# Altium footprint library Nanjar's Library.PcbLib: 153 footprints (part 6 of 10)
Each footprint in its own frame and in the unit in brackets; x right, y up, seen from the top. Pads: shape width x height; smd on the part's side, far side on the other; paste and mask are expansions set on the pad; w line width, h text height; cw(c..) or ccw(c..) is an arc to the next point about the centre after c.
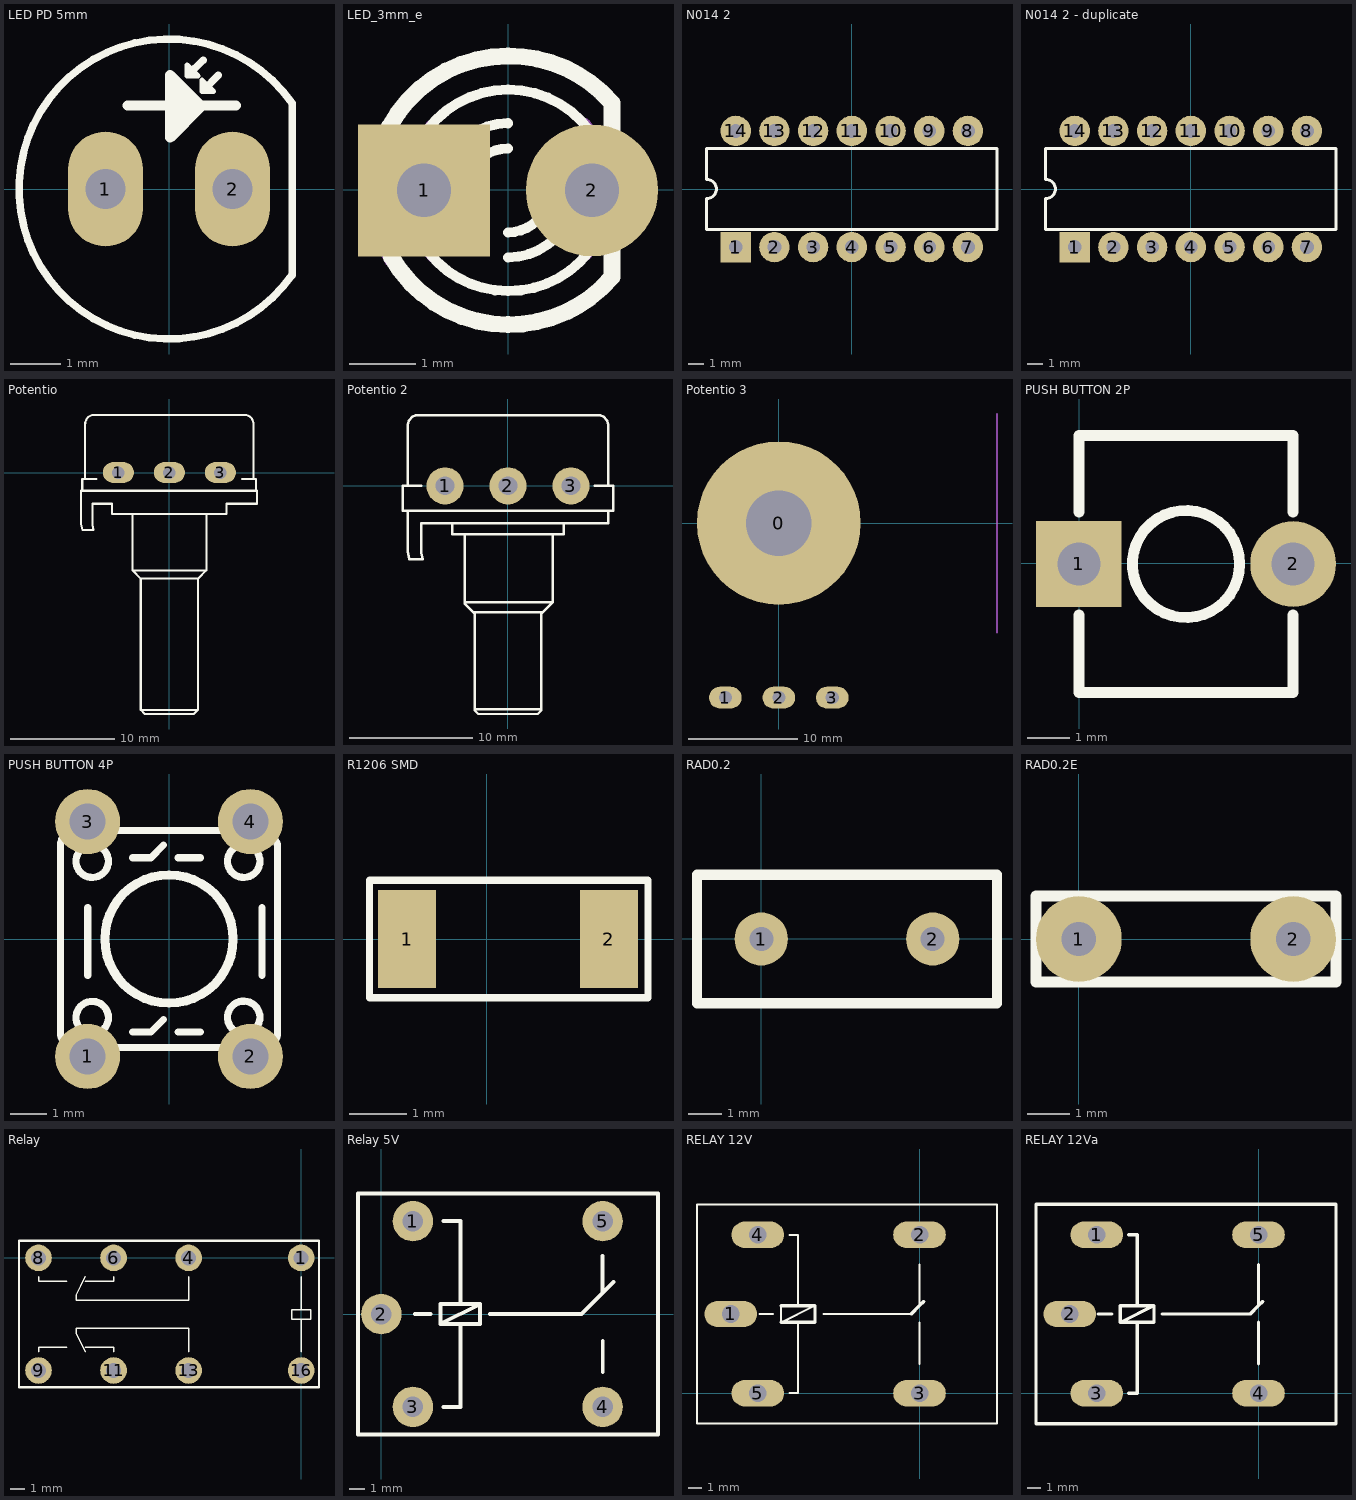
[diagram p5: the footprints below, top view; thin cyan lines are the x and y axes]

## LED PD 5mm [mm]
pads (2):
  oval 1.5x2.3 hole 0.8: 1(-1.27,0) 2(1.27,0)
Top Overlay:
  lines w0.1: 0.128,1.765 0.128,1.986 0.352,1.762 ; 0.155,1.316 0.379,1.54 0.158,1.54 ; 0.36,2.261 0.584,2.261 0.36,2.485 0.36,2.264 ; 0.664,1.954 0.888,1.954 0.664,2.178 0.664,1.957
  lines w0.15: 0.386,2.285 0.68,2.579 ; 0.69,1.978 0.984,2.272 ; 2.458,-1.72 cw(c0,0) 2.458,1.72 ; 2.46,-1.72 2.46,0.45 ; 2.46,0.453 2.46,1.715
  lines w0.2: -0.825,1.666 1.34,1.666 ; 0.024,1.025 0.637,1.638 ; 0.024,1.026 0.024,2.279 0.637,1.666
  lines w0.3: 0.128,1.762 0.352,1.762 ; 0.155,1.316 0.155,1.54
3D body "User Library-Photo Diode.step": height 8.5, standoff -2, extent -3,-3 2.5,3

## LED_3mm_e [mm]
pads (2):
  rect 2x2 hole 0.813: 1(-1.27,-0.009)
  round 2 hole 0.813: 2(1.27,-0.009)
Top Overlay:
  lines w0.152: -1.22,0.905 cw(c0,-0.009) 0,1.515 cw(c0.005,-0.012) 1.244,0.88 ; -1.203,-0.945 ccw(c0,-0.009) 0,-1.533 ccw(c0.008,0.007) 1.219,-0.945 ; -1.016,-0.009 cw(c0,-0.009) 0,1.007 ; -0.635,-0.009 cw(c0,-0.009) 0,0.626 ; 0,-1.025 ccw(c0,-0.009) 1.016,-0.009 ; 0,-0.644 ccw(c0,-0.009) 0.635,-0.009
  lines w0.254: -1.793,0.956 cw(c-0.008,-0.005) 0,2.023 cw(c0.028,-0.014) 1.574,1.312 ; -1.765,-1.017 ccw(c0,-0.009) 0,-2.041 ccw(c0.011,0.016) 1.574,-1.322 ; 1.574,-1.279 1.574,1.261
Mechanical 16:
  lines w0.152: -1.171,0.981 ccw(c0.02,-0.002) -1.524,-0.009 ccw(c0,-0.009) -1.139,-1.022 ; 1.168,1.007 cw(c-0.027,0.018) 1.524,-0.009 cw(c0.011,-0.041) 1.193,-0.985
  lines w0.254: -1.789,0.956 ccw(c0.003,-0.008) -2.032,-0.009 ccw(c0,-0.009) -1.731,-1.074

## N014 2 [mm] "DIP; 14 Leads; Row Spacing 7.62 mm; Pitch 2.54 mm"
height 5.08
pads (14):
  rect 2x2 hole 0.9: 1(-7.62,-3.81)
  round 2 hole 0.9: 2(-5.08,-3.81) 3(-2.54,-3.81) 4(0,-3.81) 5(2.54,-3.81) 6(5.08,-3.81) 7(7.62,-3.81) 8(7.62,3.81) 9(5.08,3.81) 10(2.54,3.81) 11(0,3.81) 12(-2.54,3.81) 13(-5.08,3.81) 14(-7.62,3.81)
Top Overlay:
  lines w0.2: -9.525,-2.65 9.525,-2.65 9.525,2.65 -9.525,2.65 -9.525,0.635 cw(c-9.525,0) -9.525,-0.635 -9.525,-2.65
3D body "SW3DPS-DIP-14-DEFAULT.STEP": height 3.51, standoff -3.47, extent -9.525,-3.95 9.525,4.05

## N014 2 - duplicate [mm] "DIP; 14 Leads; Row Spacing 7.62 mm; Pitch 2.54 mm"
height 5.08
pads (14):
  rect 2x2 hole 0.9: 1(-7.62,-3.81)
  round 2 hole 0.9: 2(-5.08,-3.81) 3(-2.54,-3.81) 4(0,-3.81) 5(2.54,-3.81) 6(5.08,-3.81) 7(7.62,-3.81) 8(7.62,3.81) 9(5.08,3.81) 10(2.54,3.81) 11(0,3.81) 12(-2.54,3.81) 13(-5.08,3.81) 14(-7.62,3.81)
Top Overlay:
  lines w0.2: -9.525,-2.65 9.525,-2.65 9.525,2.65 -9.525,2.65 -9.525,0.635 cw(c-9.525,0) -9.525,-0.635 -9.525,-2.65
3D body "User Library-14pin 0_3inch 2_54mm IC DIP Socket.STEP": height 5.2, standoff -2.8, extent -8.88,-5.1 8.9,5.06
3D body "SW3DPS-DIP-14-DEFAULT.STEP": height 7.51, standoff 0.53, extent -9.525,-3.95 9.525,4.05

## Potentio [mm]
pads (3):
  oval 3x2 hole 1.2: 1(-4.9,0) 2(0,0) 3(4.9,0)
Top Overlay:
  lines w0.2: -8.375,-1.75 -8.375,-0.625 -7,-0.625 ; -8.1,-5.525 -7.8,-5.525 ; -8.1,-0.625 -8.1,4.601 cw(c-7.076,4.601) -7.8,5.325 cw(c-7.317,4.842) -7.317,5.525 ; -7.3,5.525 7.3,5.525 ; -3.55,-4 -3.55,-9.4 ; 3.55,-4 3.55,-9.4 ; 7,-0.625 8.325,-0.625 8.325,-1.75 -8.5,-1.75 -8.5,-3.025 -8.5,-4.925 -8.35,-5.525 -7.275,-5.525 -7.4,-5.025 -7.4,-3 -5.5,-3 -5.5,-4 5.5,-4 5.5,-3 8.425,-3 8.425,-1.75 ; 7.317,5.525 cw(c7.317,4.842) 7.8,5.325 cw(c7.076,4.601) 8.1,4.601 8.1,-0.625 ; -3.55,-9.4 3.55,-9.4 ; -3.55,-9.4 -2.75,-10.2 ; -2.75,-22.8 -2.35,-23.2 0,-23.2 2.35,-23.2 2.75,-22.8 ; -2.75,-22.8 2.75,-22.8 ; -2.75,-22.8 -2.75,-10.2 ; -2.75,-10.2 2.75,-10.2 ; 2.75,-22.8 2.75,-10.2 ; 2.75,-10.2 3.55,-9.4
3D body "Potentiometer.step": height 20.98, standoff -3.95, extent -8.489,-23.3 8.436,5.4

## Potentio 2 [mm]
pads (3):
  round 3 hole 1.5: 1(-5.08,0) 2(0,0) 3(5.08,0)
Top Overlay:
  lines w0.2: -8.1,-2 -8.1,-3.4 -8.1,-5.3 -7.95,-5.9 -6.875,-5.9 -7,-5.4 -7,-3 8.1,-3 8.1,-2 ; -8.1,0 -8.1,4.776 cw(c-7.076,4.776) -7.8,5.5 cw(c-7.317,5.017) -7.317,5.7 ; -7.7,-5.9 -7.4,-5.9 ; -7.3,5.7 7.3,5.7 ; -7,0 -8.5,0 -8.5,-2 8.5,-2 8.5,0 7,0 ; -4.5,-3 -4.5,-3.9 4.5,-3.9 4.5,-3 ; -3.5,-9.4 3.6,-9.4 ; -3.5,-3.9 -3.5,-9.5 -2.7,-10.3 -2.7,-18.1 -2.4,-18.4 2.4,-18.4 2.7,-18.1 2.7,-10.3 3.6,-9.4 ; -2.8,-10.2 2.8,-10.2 ; -2.7,-18 2.7,-18 ; 3.6,-3.9 3.6,-9.4 ; 7.317,5.7 cw(c7.317,5.017) 7.8,5.5 cw(c7.076,4.776) 8.1,4.776 8.1,0
3D body "User Library-TrimPot.step": height 22.1, standoff -3.1, extent -8.482,-18.425 8.482,5.775

## Potentio 3 [mm]
pads (4):
  round 15 hole 6: 0(0,0)
  oval 3x2 hole 1.2: 1(-4.9,-16) 2(0,-16) 3(4.9,-16)
Mechanical 1:
  lines w0.2: 20,-10 20,10

## PUSH BUTTON 2P [mm]
pads (2):
  rect 2x2 hole 1: 1(-0.008,-0.012)
  round 2 hole 1: 2(4.992,-0.012)
Top Overlay:
  circle w0.254: c2.492,-0.012 r1.25
  lines w0.254: -0.008,-1.2 -0.008,-3.012 4.992,-3.012 4.992,-1.2 ; -0.008,1.2 -0.008,2.988 4.992,2.988 4.992,1.2
3D body "SW TACT.step": height 4.5, standoff -1.2, extent -0.54,-3.02 5.46,3.18

## PUSH BUTTON 4P [mm]
pads (4):
  round 1.8 hole 1: 1(-2.25,-3.25) 2(2.25,-3.25) 3(-2.25,3.25) 4(2.25,3.25)
Top Overlay:
  circle w0.254: c0,0 r1.775
  circle w0.2: c-2.123,-2.174 r0.448
  circle w0.2: c2.068,-2.167 r0.448
  circle w0.2: c2.068,2.151 r0.448
  circle w0.2: c-2.123,2.151 r0.448
  lines w0.2: -2.25,-1 -2.25,0.275 ; -2.25,0.25 -2.25,0.875 ; -1,-2.575 -0.5,-2.575 -0.15,-2.225 ; -1,2.25 -0.5,2.25 -0.15,2.6 ; 0.25,-2.575 0.875,-2.575 ; 0.25,2.25 0.875,2.25 ; 2.322,3 cw(c2.461,2.461) 3,2.6 3,-2.6 cw(c2.6,-2.6) 2.6,-3 -2.6,-3 cw(c-2.6,-2.6) -3,-2.6 -3,2.6 cw(c-2.6,2.6) -2.6,3 2.6,3 ; 2.575,-1 2.575,0.25 2.575,0.875
3D body "User Library-TPxxxx (Switch).step": height 4.95, standoff -3.54, extent -3.012,-3.932 2.988,4.036

## R1206 SMD [mm] "Capasitor SMD"
pads (2):
  rect 1x1.7 smd: 1(-1.381,0) 2(2.118,0)
Top Overlay:
  lines w0.127: -2.032,-1.016 2.794,-1.016 2.794,1.016 -2.032,1.016 -2.032,-1.016
3D body "User Library RES 1206.step": height 0.85, standoff 0, extent -1.294,-0.865 2.056,0.865

## RAD0.2 [mil]
pads (2):
  round 62 hole 28: 1(-0.19,-0.11) 2(199.81,-0.11)
Top Overlay:
  lines w12: -75.19,-75.11 -75.19,74.89 274.81,74.89 274.81,-75.11 -75.19,-75.11

## RAD0.2E [mm]
pads (2):
  round 2 hole 0.8: 1(0,0) 2(5,0)
Top Overlay:
  lines w0.254: -1,-1 6,-1 6,1 -1,1 -1,-1

## Relay [mil]
pads (8):
  round 71 hole 40: 1(-0.17,-0.13) 4(-300.17,-0.13) 6(-500.17,-0.13) 8(-700.17,-0.13) 9(-700.17,-300.13) 11(-500.17,-300.13) 13(-300.17,-300.13) 16(-0.17,-300.13)
Top Overlay:
  lines w4: -700.17,-250.13 -700.17,-238.13 -625.17,-238.13 ; -700.17,-50.13 -700.17,-62.63 -625.17,-62.63 ; -575.17,-250.13 -600.17,-200.13 -600.17,-188.13 -300.17,-188.13 -300.17,-250.13 ; -575.17,-238.13 -500.17,-238.13 -500.17,-250.13 ; -575.17,-62.63 -500.17,-62.63 -500.17,-50.13 ; -575.17,-50.13 -600.17,-100.13 -600.17,-112.63 -300.17,-112.63 -300.17,-50.13 ; -0.17,-250.13 -0.17,-163.13 ; -0.17,-50.13 -0.17,-137.63 ; -0.17,-163.13 24.83,-163.13 24.83,-137.63 -0.17,-137.63 ; -0.17,-163.13 -25.17,-163.13 -25.17,-137.63 -0.17,-137.63
  lines w6: -752.17,-345.13 47.43,-345.13 47.43,45.9 -752.17,45.9 -752.17,-345.13

## Relay 5V [mil]
pads (5):
  round 102.36 hole 52: 1(80,235) 2(0,0) 3(80,-235) 4(560,-235) 5(560,235)
Top Overlay:
  lines w10: 85,0 125,0 ; 150,-25 250,25 ; 157.48,-235 200,-235 200,-25 ; 157.48,235 200,235 200,25 ; 275,0 506.5,0 559.8,53.31 559.8,147 ; 559.69,53.19 587.89,81.4 ; 560.2,-147 560.2,-67.68 ; 200,-25 149.8,-25 149.8,25 200,25 ; 200,-25 249.8,-25 249.8,25 200,25 ; -59,-305 700,-305 700,305.24 -59,305.24 -59,-305
3D body "User Library-SONGLE Relay SRU-12VDC-SL-C.STEP": height 602.36, standoff -196.85, extent -55,-305.12 696.97,305.12

## RELAY 12V [mil]
pads (5):
  oval 156x78 hole 52: 1(-560.47,235.08) 2(-0.47,470.08) 3(-0.47,0.08) 4(-480.47,470.08) 5(-480.47,0.08)
Top Overlay:
  lines w6: -475.47,235.08 -435.47,235.08 ; -410.67,210.08 -410.67,260.08 ; -410.47,210.08 -310.47,260.08 ; -385.47,0.08 -360.47,0.08 -360.47,210.08 ; -385.47,470.08 -360.47,470.08 -360.47,260.08 ; -285.47,235.08 -25.47,235.08 ; -0.67,259.88 -0.67,382.08 ; -0.47,87.08 -0.47,210.08 ; -660.47,-89.92 229.33,-89.92 229.33,560.08 -660.47,560.08 -660.47,-89.92
  lines w10: -410.67,210.08 -360.47,210.08 -310.67,210.08 -310.67,260.08 -360.47,260.08 -410.67,260.08 ; -25.47,235.08 -0.67,259.88 ; -0.47,260.08 12.53,272.08

## RELAY 12Va [mil]
pads (5):
  oval 156x78 hole 52: 1(-480.47,470.08) 2(-560.47,235.08) 3(-480.47,0.08) 4(-0.47,0.08) 5(-0.47,470.08)
Top Overlay:
  lines w10: -475.47,235.08 -435.47,235.08 ; -410.47,210.08 -310.47,260.08 ; -385.47,0.08 -360.47,0.08 -360.47,210.08 ; -385.47,470.08 -360.47,470.08 -360.47,260.08 ; -285.47,235.08 -25.47,235.08 -0.67,259.88 -0.67,382.08 ; -0.47,87.08 -0.47,210.08 ; -0.47,260.08 12.53,272.08 ; -360.47,210.08 -410.67,210.08 -410.67,260.08 -360.47,260.08 ; -360.47,210.08 -310.67,210.08 -310.67,260.08 -360.47,260.08 ; -660.47,-89.92 229.33,-89.92 229.33,560.08 -660.47,560.08 -660.47,-89.92
3D body "User Library-RELAY  12MMx12MM SQUARE-1.step": height 590.55, standoff -78.74, extent -668.7,-78.74 118.7,551.18